# Altium schematic symbol library LATTICEPLDS_Library.SchLib: 291 symbols (part 10 of 32)
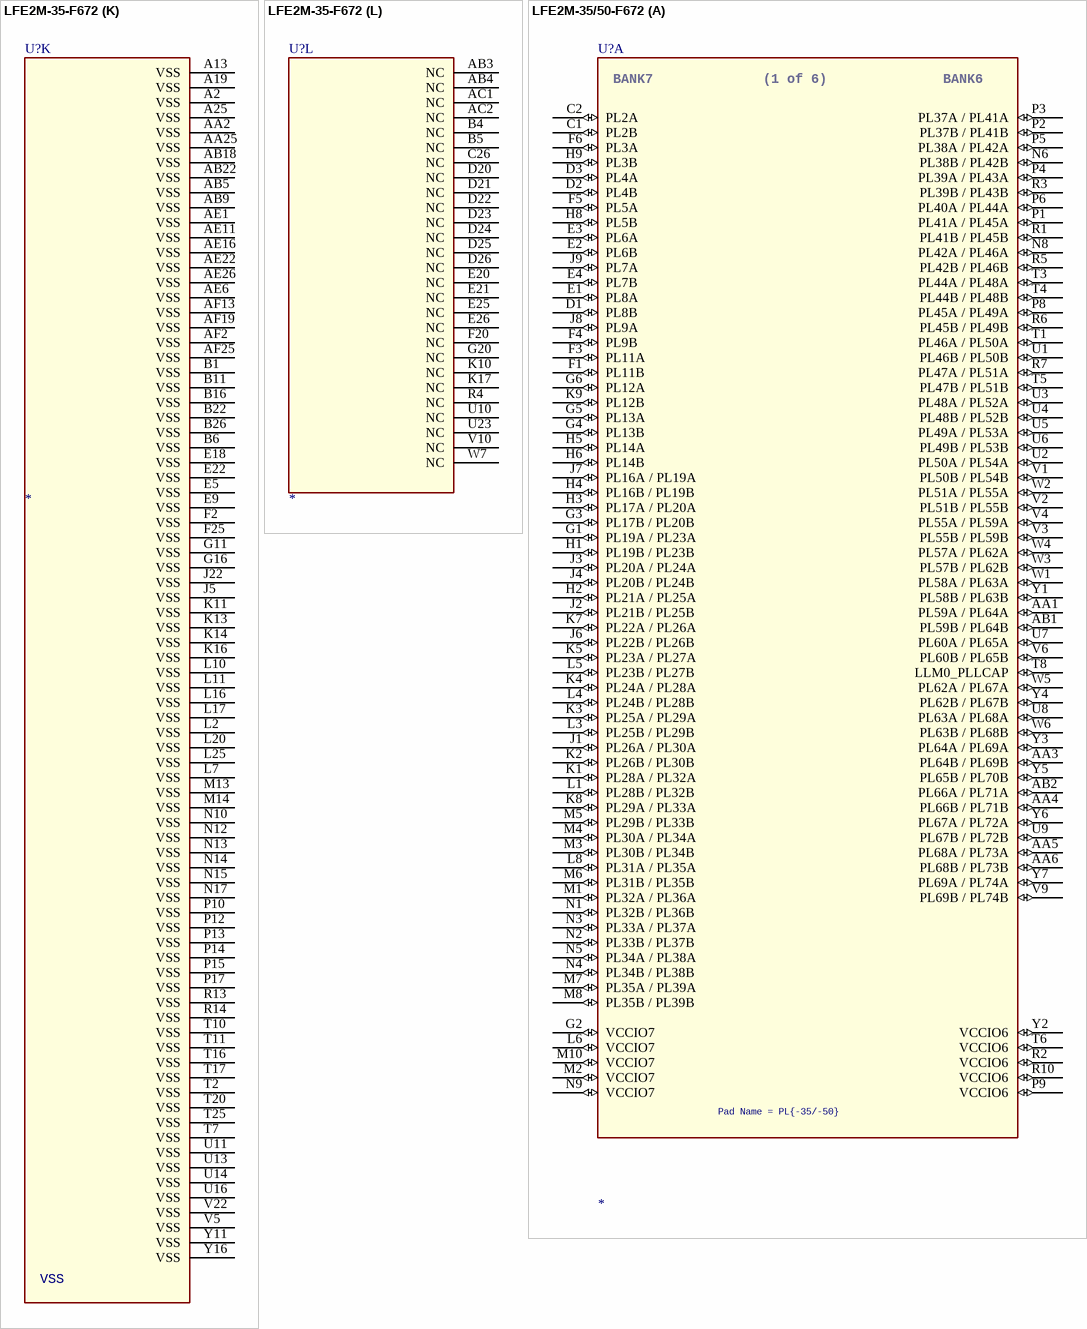
[diagram p312: symbols LFE2M-35-F672 to LFE2M-35/50-F672]

## LFE2M-35-F672
designator U?
SWAP_INFO: (S1+S2+S3+S4+S5+S6+S7+S8+S9+S10+S11+S12); SPLIT_INST: TRUE
part A pins: A14 U_HDINP3, A15 U_HDINP2, A17 U_HDOUTP3, A18 U_HDOUTP2, A20 U_HDOUTP1, A21 U_HDOUTP0, A23 U_HDINP1, A24 U_HDINP0, AB19 L_REFCLKN, AC19 L_REFCLKP, AE14 L_HDINN3, AE15 L_HDINN2, AE17 L_HDOUTN3, AE18 L_HDOUTN2, AE20 L_HDOUTN1, AE21 L_HDOUTN0, AE23 L_HDINN1, AE24 L_HDINN0, AF14 L_HDINP3, AF15 L_HDINP2, AF17 L_HDOUTP3, AF18 L_HDOUTP2, AF20 L_HDOUTP1, AF21 L_HDOUTP0, AF23 L_HDINP1, AF24 L_HDINP0, B14 U_HDINN3, B15 U_HDINN2, B17 U_HDOUTN3, B18 U_HDOUTN2, B20 U_HDOUTN1, B21 U_HDOUTN0, B23 U_HDINN1, B24 U_HDINN0, D19 U_REFCLKP, E19 U_REFCLKN
part B pins: AA21 CFG2, AA22 CFG1, AA23 INITN, AB23 CFG0, AB24 CCLK, AB25 DONE, AC3 TCK, AC4 TMS, AC26 PROGRAMN, V8 TDO, W8 TDI
part C pins: AA8 PB4B, AA9 PB8A, AA10 PB14A, AA12 PB21B, AA13 PB33A, AA14 PB42B, AA15 PB51A, AA17 PB60A, AA18 PB61A, AA19 PB65B, AA20 PB73B, AB6 PB2A, AB7 PB6A, AB8 PB12B, AB10 PB16B, AB11 PB19B, AB12 PB24B, AB13 PB33B, AB14 PB42A, AB15 PB49A, AB16 PB50B, AB17 PB54B, AB20 PB57A, AB21 PB69B, AC5 PB4A, AC6 PB5A, AC7 PB9A, AC8 PB14B, AC9 PB15B, AC10 PB23B, AC11 PB24A, AC12 PB34B, AC13 PB40A, AC14 PB41B, AC15 PB48A, AC16 PB49B, AC17 PB52B, AC20 PB58A, AC21 PB63A, AC22 PB69A, AC23 PB71A, AC25 PB71B, AD1 PB3A, AD2 PB3B, AD3 PB7A, AD4 PB7B, AD5 PB10B, AD6 PB13B, AD7 PB20A, AD8 PB21A, AD9 PB23A, AD10 PB25A, AD11 PB28A, AD12 PB35B, AD26 PB70B, AE2 PB10A, AE3 PB11B, AE4 PB11A, AE5 PB13A, AE8 PB22A, AE9 PB26B, AE10 PB27B, AF3 PB17A, AF4 PB17B, AF5 PB18A, AF6 PB18B, AF7 PB20B, AF8 PB22B, AF9 PB26A, AF10 PB27A, AF11 PB28B, AF12 PB35A, V17 PB73A, W9 PB5B, W10 PB8B, W11 PB12A, W12 PB15A, W13 PB16A, W14 PB34A, W15 PB54A, W16 PB59B, W17 PB65A, W20 PB72B, Y8 PB2B, Y9 PB6B, Y10 PB9B, Y12 PB19A, Y13 PB25B, Y14 PB40B, Y15 PB52A, Y17 PB61B, Y18 PB68B
part D pins: AA1 PL59A, AA3 PL64B, AA4 PL66B, AA5 PL68A, AA6 PL68B, AB1 PL59B, AB2 PL66A, C1 PL2B, C2 PL2A, D1 PL8B, D2 PL4B, D3 PL4A, E1 PL8A, E2 PL6B, E3 PL6A, E4 PL7B, F1 PL11B, F3 PL11A, F4 PL9B, F5 PL5A, F6 PL3A, G1 PL19A, G3 PL17B, G4 PL13B, G5 PL13A, G6 PL12A, H1 PL19B, H2 PL21A, H3 PL17A, H4 PL16B, H5 PL14A, H6 PL14B, H8 PL5B, H9 PL3B, J1 PL26A, J2 PL21B, J3 PL20A, J4 PL20B, J6 PL22B, J7 PL16A, J8 PL9A, J9 PL7A, K1 PL28A, K2 PL26B, K3 PL25A, K4 PL24A, K5 PL23A, K7 PL22A, K8 PL29A, K9 PL12B, L1 PL28B, L3 PL25B, L4 PL24B, L5 PL23B, L8 PL31A, M1 PL32A, M3 PL30B, M4 PL30A, M5 PL29B, M6 PL31B, M7 PL35A, M8 PL35B, N1 PL32B, N2 PL33B, N3 PL33A, N4 PL34B, N5 PL34A, N6 PL38B, N7 PL40B, N8 PL42A, P1 PL41A, P2 PL37B, P3 PL37A, P4 PL39A, P5 PL38A, P6 PL40A, P8 PL45A, R1 PL41B, R3 PL39B, R5 PL42B, R6 PL45B, R7 PL47A, T1 PL46A, T3 PL44A, T4 PL44B, T5 PL47B, U1 PL46B, U2 PL50A, U3 PL48A, U4 PL48B, U5 PL49A, U6 PL49B, U7 PL60A, U8 PL63A, U9 PL67B, V1 PL50B, V2 PL51B, V3 PL55B, V4 PL55A, V6 PL60B, V7 PL65A, V9 PL69B, W1 PL58A, W2 PL51A, W3 PL57B, W4 PL57A, W5 PL62A, W6 PL63B, Y1 PL58B, Y3 PL64A, Y4 PL62B, Y5 PL65B, Y6 PL67A, Y7 PL69A
part E pins: AA24 PR64A, AA26 PR59B, AB26 PR67B, E23 PR9A, E24 PR9B, F21 PR12A, F22 PR14A, F23 PR13B, F24 PR13A, F26 PR11A, G21 PR19B, G22 PR16B, G23 PR15A, G24 PR15B, G26 PR11B, H20 PR12B, H21 PR22B, H22 PR21B, H23 PR18B, H24 PR18A, H25 PR17B, H26 PR17A, J18 PR14B, J19 PR19A, J20 PR21A, J21 PR23A, J23 PR24B, J24 PR24A, J25 PR20B, J26 PR20A, K18 PR22A, K19 PR16A, K20 PR23B, K21 PR25A, K22 PR29B, K23 PR26A, K24 PR26B, K25 PR28B, K26 PR28A, L19 PR25B, L22 PR32B, L23 PR31B, L24 PR32A, L26 PR30A, M19 PR29A, M20 PR31A, M21 PR37B, M22 PR34B, M23 PR33B, M24 PR34A, M26 PR30B, N19 PR42A, N20 PR39B, N21 PR40B, N22 PR39A, N23 PR37A, N24 PR35B, N25 PR35A, N26 PR33A, P19 PR45A, P21 PR45B, P22 PR40A, P23 PR41B, P24 PR41A, P25 PR38B, P26 PR38A, R19 PR48A, R20 PR47A, R21 PR47B, R22 PR42B, R23 PR44B, R24 PR44A, R26 PR46A, T19 PR48B, T22 PR50B, T23 PR50A, T24 PR51A, T26 PR46B, U18 PR54B, U19 PR60A, U20 PR58A, U21 PR56A, U22 PR54A, U24 PR51B, U25 PR49B, U26 PR49A, V20 PR63A, V21 PR60B, V23 PR58B, V24 PR57A, V25 PR53B, V26 PR53A, W18 PR65A, W19 PR66B, W21 PR63B, W22 PR65B, W23 PR62B, W24 PR57B, W25 PR55B, W26 PR55A, Y19 PR68B, Y20 PR66A, Y21 PR68A, Y22 PR67A, Y23 PR64B, Y24 PR62A, Y26 PR59A
part F pins: A3 PT13A, A4 PT13B, A5 PT14A, A6 PT14B, A7 PT19A, A8 PT22A, A9 PT24B, A10 PT32B, A11 PT35A, A12 PT35B, B2 PT6B, B3 PT7B, B8 PT19B, B9 PT22B, B10 PT32A, C3 PT4B, C4 PT6A, C5 PT7A, C6 PT12B, C7 PT17A, C8 PT16B, C9 PT20A, C10 PT23B, C11 PT36B, C12 PT37B, D4 PT4A, D5 PT10B, D6 PT17B, D7 PT11B, D8 PT15B, D9 PT18B, D10 PT29B, D11 PT31B, D12 PT34B, D13 PT40A, D14 PT40B, D15 PT43A, D16 PT45A, D17 PT46A, E6 PT10A, E7 PT8A, E8 PT23A, E10 PT21A, E11 PT30B, E12 PT39A, E13 PT38A, E14 PT41A, E15 PT42A, E16 PT43B, E17 PT46B, F7 PT5A, F8 PT3A, F9 PT9A, F10 PT12A, F12 PT21B, F13 PT30A, F14 PT36A, F15 PT39B, F17 PT45B, F18 PT44A, F19 PT44B, G7 PT2A, G8 PT2B, G9 PT5B, G10 PT9B, G12 PT16A, G13 PT20B, G14 PT31A, G15 PT37A, G17 PT41B, G18 PT42B, H10 PT8B, H11 PT11A, H12 PT15A, H13 PT18A, H14 PT29A, H15 PT33A, H16 PT34A, H17 PT38B, H18 PT33B, J10 PT3B
part G pins: G19 RUM0_VCCPLL, H7 LUM0_VCCPLL, H19 XRES, J17 RUM1_VCCPLL, K6 LUM1_VCCPLL, P7 LLM2_VCCPLL, P20 RLM2_VCCPLL, R8 LLM0_VCCPLL, T8 LLM0_PLLCAP, V18 RLM0_VCCPLL, V19 RLM0_PLLCAP
part H pins: A16 U_VCCOB3 (power), A22 U_VCCOB0 (power), AD13 L_VCCRX3 (power), AD14 L_VCCRX2 (power), AD15 L_VCCIB2 (power), AD16 L_VCCTX3 (power), AD17 L_VCCTX2 (power), AD18 L_VCCOB2 (power), AD19 L_VCCP (power), AD20 L_VCCOB1 (power), AD21 L_VCCTX1 (power), AD22 L_VCCTX0 (power), AD23 L_VCCIB1 (power), AD24 L_VCCRX1 (power), AD25 L_VCCRX0 (power), AE13 L_VCCIB3 (power), AE19 L_VCCAUX33 (power), AE25 L_VCCIB0 (power), AF16 L_VCCOB3 (power), AF22 L_VCCOB0 (power), B13 U_VCCIB3 (power), B19 U_VCCAUX33 (power), B25 U_VCCIB0 (power), C13 U_VCCRX3 (power), C14 U_VCCRX2 (power), C15 U_VCCIB2 (power), C16 U_VCCTX3 (power), C17 U_VCCTX2 (power), C18 U_VCCOB2 (power), C19 U_VCCP (power), C20 U_VCCOB1 (power), C21 U_VCCTX1 (power), C22 U_VCCTX0 (power), C23 U_VCCIB1 (power), C24 U_VCCRX1 (power), C25 U_VCCRX0 (power)
part I pins: L12 VCC (power), L13 VCC (power), L14 VCC (power), L15 VCC (power), M11 VCC (power), M12 VCC (power), M15 VCC (power), M16 VCC (power), N11 VCC (power), N16 VCC (power), P11 VCC (power), P16 VCC (power), R11 VCC (power), R12 VCC (power), R15 VCC (power), R16 VCC (power), T12 VCC (power), T13 VCC (power), T14 VCC (power), T15 VCC (power)
part J pins: AA7 VCCJ (power), AA11 VCCIO5 (power), AA16 VCCIO4 (power), AC18 VCCIO4 (power), AC24 VCCIO8 (power), AE7 VCCIO5 (power), AE12 VCCIO5 (power), B7 VCCIO0 (power), B12 VCCIO0 (power), D18 VCCIO1 (power), F11 VCCIO0 (power), F16 VCCIO1 (power), G2 VCCIO7 (power), G25 VCCIO2 (power), J11 VCCAUX (power), J12 VCCAUX (power), J13 VCCIO0 (power), J14 VCCIO1 (power), J15 VCCAUX (power), J16 VCCAUX (power), K12 VCCIO0 (power), K15 VCCIO1 (power), L6 VCCIO7 (power), L9 VCCAUX (power), L18 VCCAUX (power), L21 VCCIO2 (power), M2 VCCIO7 (power), M9 VCCAUX (power), M10 VCCIO7 (power), M17 VCCIO2 (power), M18 VCCAUX (power), M25 VCCIO2 (power), N9 VCCIO7 (power), N18 VCCIO2 (power), P9 VCCIO6 (power), P18 VCCIO3 (power), R2 VCCIO6 (power), R9 VCCAUX (power), R10 VCCIO6 (power), R17 VCCIO3 (power), R18 VCCAUX (power), R25 VCCIO3 (power), T6 VCCIO6 (power), T9 VCCAUX (power), T18 VCCAUX (power), T21 VCCIO3 (power), U12 VCCIO5 (power), U15 VCCIO4 (power), U17 VCCIO8 (power), V11 VCCAUX (power), V12 VCCAUX (power), V13 VCCIO5 (power), V14 VCCIO4 (power), V15 VCCAUX (power), V16 VCCAUX (power), Y2 VCCIO6 (power), Y25 VCCIO3 (power)
part K pins: A2 VSS (power), A13 VSS (power), A19 VSS (power), A25 VSS (power), AA2 VSS (power), AA25 VSS (power), AB5 VSS (power), AB9 VSS (power), AB18 VSS (power), AB22 VSS (power), AE1 VSS (power), AE6 VSS (power), AE11 VSS (power), AE16 VSS (power), AE22 VSS (power), AE26 VSS (power), AF2 VSS (power), AF13 VSS (power), AF19 VSS (power), AF25 VSS (power), B1 VSS (power), B6 VSS (power), B11 VSS (power), B16 VSS (power), B22 VSS (power), B26 VSS (power), E5 VSS (power), E9 VSS (power), E18 VSS (power), E22 VSS (power), F2 VSS (power), F25 VSS (power), G11 VSS (power), G16 VSS (power), J5 VSS (power), J22 VSS (power), K11 VSS (power), K13 VSS (power), K14 VSS (power), K16 VSS (power), L2 VSS (power), L7 VSS (power), L10 VSS (power), L11 VSS (power), L16 VSS (power), L17 VSS (power), L20 VSS (power), L25 VSS (power), M13 VSS (power), M14 VSS (power), N10 VSS (power), N12 VSS (power), N13 VSS (power), N14 VSS (power), N15 VSS (power), N17 VSS (power), P10 VSS (power), P12 VSS (power), P13 VSS (power), P14 VSS (power), P15 VSS (power), P17 VSS (power), R13 VSS (power), R14 VSS (power), T2 VSS (power), T7 VSS (power), T10 VSS (power), T11 VSS (power), T16 VSS (power), T17 VSS (power), T20 VSS (power), T25 VSS (power), U11 VSS (power), U13 VSS (power), U14 VSS (power), U16 VSS (power), V5 VSS (power), V22 VSS (power), Y11 VSS (power), Y16 VSS (power)
part L pins: AB3 NC, AB4 NC, AC1 NC, AC2 NC, B4 NC, B5 NC, C26 NC, D20 NC, D21 NC, D22 NC, D23 NC, D24 NC, D25 NC, D26 NC, E20 NC, E21 NC, E25 NC, E26 NC, F20 NC, G20 NC, K10 NC, K17 NC, R4 NC, U10 NC, U23 NC, V10 NC, W7 NC
part A text: SERDES
part B text: CONFIG
part C text: Bank5; Bank4; Bottom
part D text: Bank7; Bank6; Left
part E text: Bank2; Bank3; Right
part F text: Bank0; Top
part G text: PLL
part H text: SERDES Supplies
part I text: VCC Core
part J text: Power / Supplies

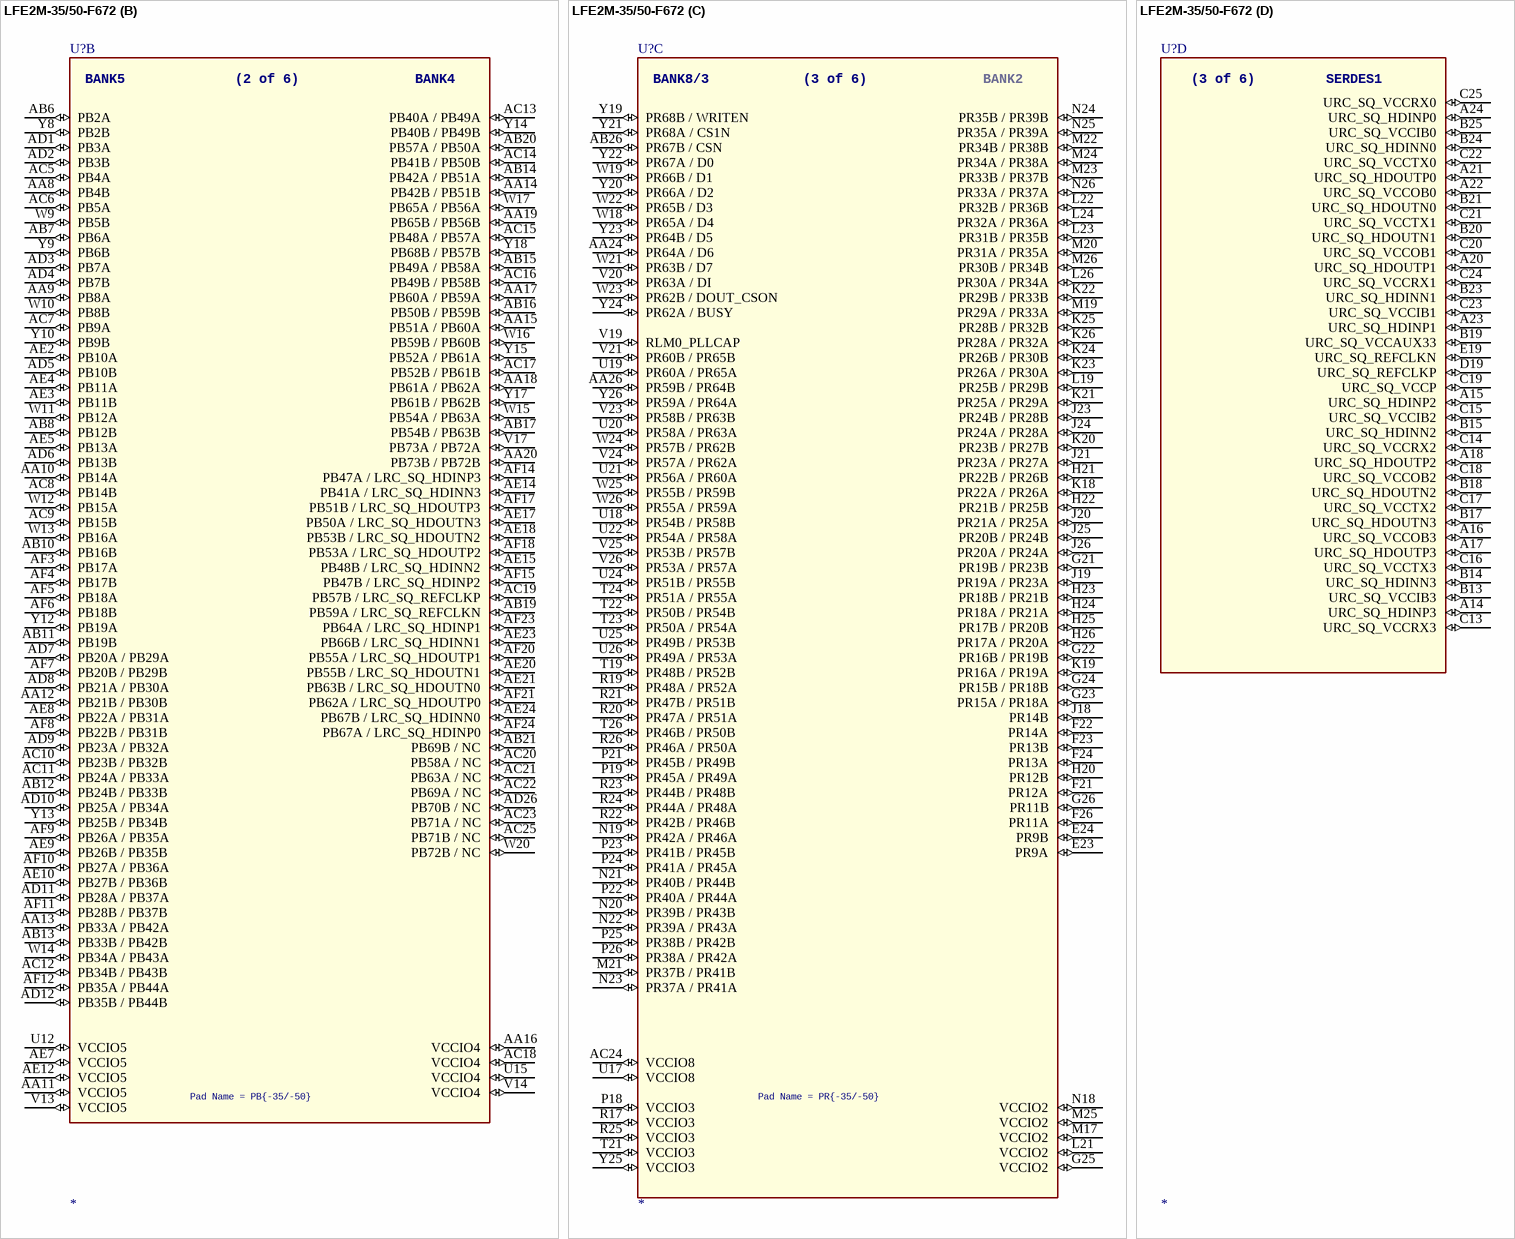
[diagram p103: symbol LFE2M-35/50-F672]

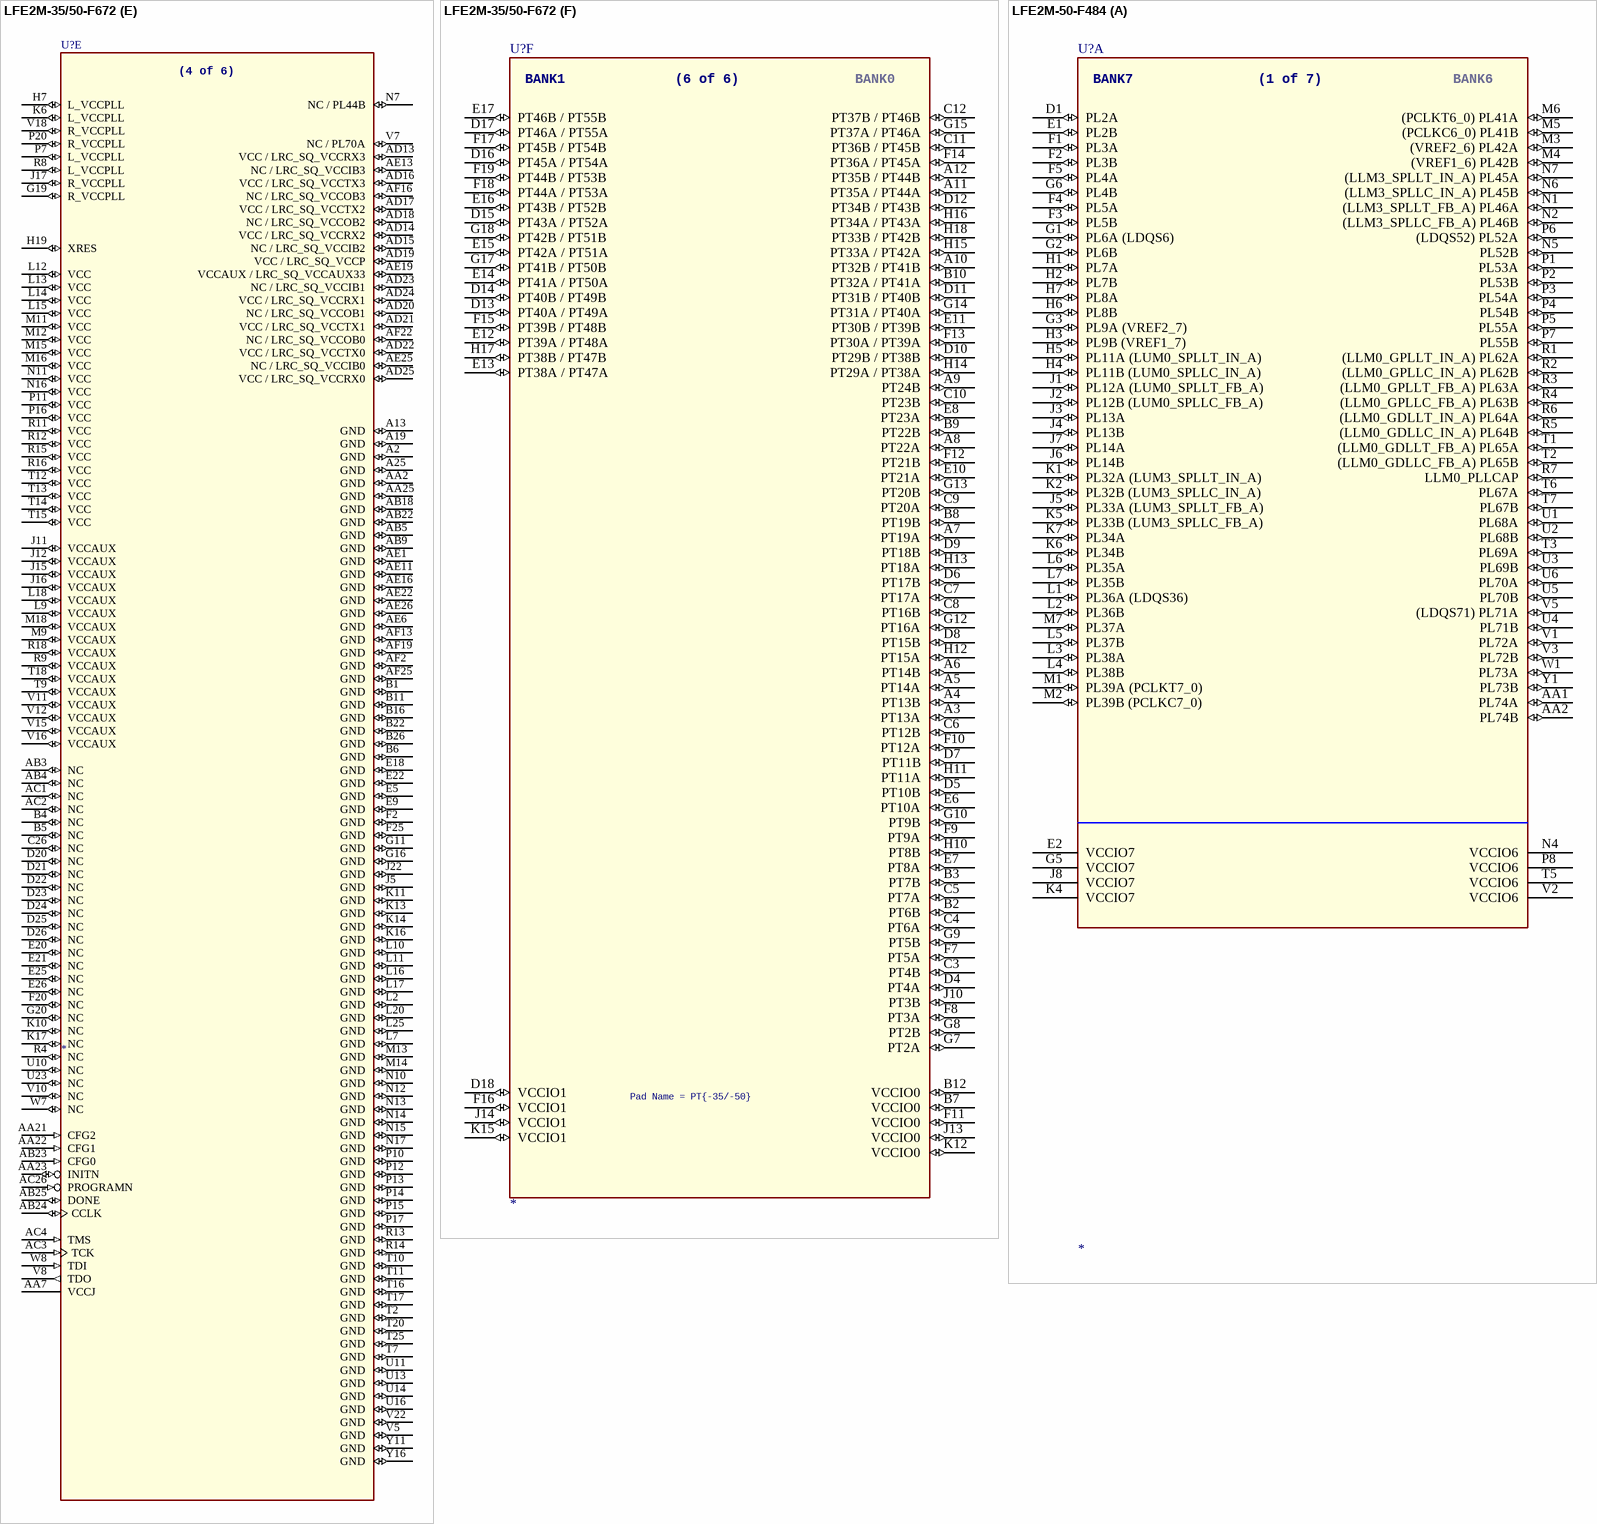
[diagram p104: symbols LFE2M-35/50-F672 to LFE2M-50-F484]

## LFE2M-35/50-F672
designator U?
SPLIT_INST: TRUE; SWAP_INFO: (S1+S2+S3+S4+S5+S6)
part A pins: AA1 PL59A / PL64A (io), AA3 PL64B / PL69B (io), AA4 PL66B / PL71B (io), AA5 PL68A / PL73A (io), AA6 PL68B / PL73B (io), AB1 PL59B / PL64B (io), AB2 PL66A / PL71A (io), C1 PL2B (io), C2 PL2A (io), D1 PL8B (io), D2 PL4B (io), D3 PL4A (io), E1 PL8A (io), E2 PL6B (io), E3 PL6A (io), E4 PL7B (io), F1 PL11B (io), F3 PL11A (io), F4 PL9B (io), F5 PL5A (io), F6 PL3A (io), G1 PL19A / PL23A (io), G2 VCCIO7 (io), G3 PL17B / PL20B (io), G4 PL13B (io), G5 PL13A (io), G6 PL12A (io), H1 PL19B / PL23B (io), H2 PL21A / PL25A (io), H3 PL17A / PL20A (io), H4 PL16B / PL19B (io), H5 PL14A (io), H6 PL14B (io), H8 PL5B (io), H9 PL3B (io), J1 PL26A / PL30A (io), J2 PL21B / PL25B (io), J3 PL20A / PL24A (io), J4 PL20B / PL24B (io), J6 PL22B / PL26B (io), J7 PL16A / PL19A (io), J8 PL9A (io), J9 PL7A (io), K1 PL28A / PL32A (io), K2 PL26B / PL30B (io), K3 PL25A / PL29A (io), K4 PL24A / PL28A (io), K5 PL23A / PL27A (io), K7 PL22A / PL26A (io), K8 PL29A / PL33A (io), K9 PL12B (io), L1 PL28B / PL32B (io), L3 PL25B / PL29B (io), L4 PL24B / PL28B (io), L5 PL23B / PL27B (io), L6 VCCIO7 (io), L8 PL31A / PL35A (io), M1 PL32A / PL36A (io), M2 VCCIO7 (io), M3 PL30B / PL34B (io), M4 PL30A / PL34A (io), M5 PL29B / PL33B (io), M6 PL31B / PL35B (io), M7 PL35A / PL39A (io), M8 PL35B / PL39B (io), M10 VCCIO7 (io), N1 PL32B / PL36B (io), N2 PL33B / PL37B (io), N3 PL33A / PL37A (io), N4 PL34B / PL38B (io), N5 PL34A / PL38A (io), N6 PL38B / PL42B (io), N8 PL42A / PL46A (io), N9 VCCIO7 (io), P1 PL41A / PL45A (io), P2 PL37B / PL41B (io), P3 PL37A / PL41A (io), P4 PL39A / PL43A (io), P5 PL38A / PL42A (io), P6 PL40A / PL44A (io), P8 PL45A / PL49A (io), P9 VCCIO6 (io), R1 PL41B / PL45B (io), R2 VCCIO6 (io), R3 PL39B / PL43B (io), R5 PL42B / PL46B (io), R6 PL45B / PL49B (io), R7 PL47A / PL51A (io), R10 VCCIO6 (io), T1 PL46A / PL50A (io), T3 PL44A / PL48A (io), T4 PL44B / PL48B (io), T5 PL47B / PL51B (io), T6 VCCIO6 (io), T8 LLM0_PLLCAP (io), U1 PL46B / PL50B (io), U2 PL50A / PL54A (io), U3 PL48A / PL52A (io), U4 PL48B / PL52B (io), U5 PL49A / PL53A (io), U6 PL49B / PL53B (io), U7 PL60A / PL65A (io), U8 PL63A / PL68A (io), U9 PL67B / PL72B (io), V1 PL50B / PL54B (io), V2 PL51B / PL55B (io), V3 PL55B / PL59B (io), V4 PL55A / PL59A (io), V6 PL60B / PL65B (io), V9 PL69B / PL74B (io), W1 PL58A / PL63A (io), W2 PL51A / PL55A (io), W3 PL57B / PL62B (io), W4 PL57A / PL62A (io), W5 PL62A / PL67A (io), W6 PL63B / PL68B (io), Y1 PL58B / PL63B (io), Y2 VCCIO6 (io), Y3 PL64A / PL69A (io), Y4 PL62B / PL67B (io), Y5 PL65B / PL70B (io), Y6 PL67A / PL72A (io), Y7 PL69A / PL74A (io)
part B pins: AA8 PB4B (io), AA9 PB8A (io), AA10 PB14A (io), AA11 VCCIO5 (io), AA12 PB21B / PB30B (io), AA13 PB33A / PB42A (io), AA14 PB42B / PB51B (io), AA15 PB51A / PB60A (io), AA16 VCCIO4 (io), AA17 PB60A / PB59A (io), AA18 PB61A / PB62A (io), AA19 PB65B / PB56B (io), AA20 PB73B / PB72B (io), AB6 PB2A (io), AB7 PB6A (io), AB8 PB12B (io), AB10 PB16B (io), AB11 PB19B (io), AB12 PB24B / PB33B (io), AB13 PB33B / PB42B (io), AB14 PB42A / PB51A (io), AB15 PB49A / PB58A (io), AB16 PB50B / PB59B (io), AB17 PB54B / PB63B (io), AB19 PB59A / LRC_SQ_REFCLKN (io), AB20 PB57A / PB50A (io), AB21 PB69B / NC (io), AC5 PB4A (io), AC6 PB5A (io), AC7 PB9A (io), AC8 PB14B (io), AC9 PB15B (io), AC10 PB23B / PB32B (io), AC11 PB24A / PB33A (io), AC12 PB34B / PB43B (io), AC13 PB40A / PB49A (io), AC14 PB41B / PB50B (io), AC15 PB48A / PB57A (io), AC16 PB49B / PB58B (io), AC17 PB52B / PB61B (io), AC18 VCCIO4 (io), AC19 PB57B / LRC_SQ_REFCLKP (io), AC20 PB58A / NC (io), AC21 PB63A / NC (io), AC22 PB69A / NC (io), AC23 PB71A / NC (io), AC25 PB71B / NC (io), AD1 PB3A (io), AD2 PB3B (io), AD3 PB7A (io), AD4 PB7B (io), AD5 PB10B (io), AD6 PB13B (io), AD7 PB20A / PB29A (io), AD8 PB21A / PB30A (io), AD9 PB23A / PB32A (io), AD10 PB25A / PB34A (io), AD11 PB28A / PB37A (io), AD12 PB35B / PB44B (io), AD26 PB70B / NC (io), AE2 PB10A (io), AE3 PB11B (io), AE4 PB11A (io), AE5 PB13A (io), AE7 VCCIO5 (io), AE8 PB22A / PB31A (io), AE9 PB26B / PB35B (io), AE10 PB27B / PB36B (io), AE12 VCCIO5 (io), AE14 PB41A / LRC_SQ_HDINN3 (io), AE15 PB48B / LRC_SQ_HDINN2 (io), AE17 PB50A / LRC_SQ_HDOUTN3 (io), AE18 PB53B / LRC_SQ_HDOUTN2 (io), AE20 PB55B / LRC_SQ_HDOUTN1 (io), AE21 PB63B / LRC_SQ_HDOUTN0 (io), AE23 PB66B / LRC_SQ_HDINN1 (io), AE24 PB67B / LRC_SQ_HDINN0 (io), AF3 PB17A (io), AF4 PB17B (io), AF5 PB18A (io), AF6 PB18B (io), AF7 PB20B / PB29B (io), AF8 PB22B / PB31B (io), AF9 PB26A / PB35A (io), AF10 PB27A / PB36A (io), AF11 PB28B / PB37B (io), AF12 PB35A / PB44A (io), AF14 PB47A / LRC_SQ_HDINP3 (io), AF15 PB47B / LRC_SQ_HDINP2 (io), AF17 PB51B / LRC_SQ_HDOUTP3 (io), AF18 PB53A / LRC_SQ_HDOUTP2 (io), AF20 PB55A / LRC_SQ_HDOUTP1 (io), AF21 PB62A / LRC_SQ_HDOUTP0 (io), AF23 PB64A / LRC_SQ_HDINP1 (io), AF24 PB67A / LRC_SQ_HDINP0 (io), U12 VCCIO5 (io), U15 VCCIO4 (io), V13 VCCIO5 (io), V14 VCCIO4 (io), V17 PB73A / PB72A (io), W9 PB5B (io), W10 PB8B (io), W11 PB12A (io), W12 PB15A (io), W13 PB16A (io), W14 PB34A / PB43A (io), W15 PB54A / PB63A (io), W16 PB59B / PB60B (io), W17 PB65A / PB56A (io), W20 PB72B / NC (io), Y8 PB2B (io), Y9 PB6B (io), Y10 PB9B (io), Y12 PB19A (io), Y13 PB25B / PB34B (io), Y14 PB40B / PB49B (io), Y15 PB52A / PB61A (io), Y17 PB61B / PB62B (io), Y18 PB68B / PB57B (io)
part C pins: AA24 PR64A / D6 (io), AA26 PR59B / PR64B (io), AB26 PR67B / CSN (io), AC24 VCCIO8 (io), E23 PR9A (io), E24 PR9B (io), F21 PR12A (io), F22 PR14A (io), F23 PR13B (io), F24 PR13A (io), F26 PR11A (io), G21 PR19B / PR23B (io), G22 PR16B / PR19B (io), G23 PR15A / PR18A (io), G24 PR15B / PR18B (io), G25 VCCIO2 (io), G26 PR11B (io), H20 PR12B (io), H21 PR22B / PR26B (io), H22 PR21B / PR25B (io), H23 PR18B / PR21B (io), H24 PR18A / PR21A (io), H25 PR17B / PR20B (io), H26 PR17A / PR20A (io), J18 PR14B (io), J19 PR19A / PR23A (io), J20 PR21A / PR25A (io), J21 PR23A / PR27A (io), J23 PR24B / PR28B (io), J24 PR24A / PR28A (io), J25 PR20B / PR24B (io), J26 PR20A / PR24A (io), K18 PR22A / PR26A (io), K19 PR16A / PR19A (io), K20 PR23B / PR27B (io), K21 PR25A / PR29A (io), K22 PR29B / PR33B (io), K23 PR26A / PR30A (io), K24 PR26B / PR30B (io), K25 PR28B / PR32B (io), K26 PR28A / PR32A (io), L19 PR25B / PR29B (io), L21 VCCIO2 (io), L22 PR32B / PR36B (io), L23 PR31B / PR35B (io), L24 PR32A / PR36A (io), L26 PR30A / PR34A (io), M17 VCCIO2 (io), M19 PR29A / PR33A (io), M20 PR31A / PR35A (io), M21 PR37B / PR41B (io), M22 PR34B / PR38B (io), M23 PR33B / PR37B (io), M24 PR34A / PR38A (io), M25 VCCIO2 (io), M26 PR30B / PR34B (io), N18 VCCIO2 (io), N19 PR42A / PR46A (io), N20 PR39B / PR43B (io), N21 PR40B / PR44B (io), N22 PR39A / PR43A (io), N23 PR37A / PR41A (io), N24 PR35B / PR39B (io), N25 PR35A / PR39A (io), N26 PR33A / PR37A (io), P18 VCCIO3 (io), P19 PR45A / PR49A (io), P21 PR45B / PR49B (io), P22 PR40A / PR44A (io), P23 PR41B / PR45B (io), P24 PR41A / PR45A (io), P25 PR38B / PR42B (io), P26 PR38A / PR42A (io), R17 VCCIO3 (io), R19 PR48A / PR52A (io), R20 PR47A / PR51A (io), R21 PR47B / PR51B (io), R22 PR42B / PR46B (io), R23 PR44B / PR48B (io), R24 PR44A / PR48A (io), R25 VCCIO3 (io), R26 PR46A / PR50A (io), T19 PR48B / PR52B (io), T21 VCCIO3 (io), T22 PR50B / PR54B (io), T23 PR50A / PR54A (io), T24 PR51A / PR55A (io), T26 PR46B / PR50B (io), U17 VCCIO8 (io), U18 PR54B / PR58B (io), U19 PR60A / PR65A (io), U20 PR58A / PR63A (io), U21 PR56A / PR60A (io), U22 PR54A / PR58A (io), U24 PR51B / PR55B (io), U25 PR49B / PR53B (io), U26 PR49A / PR53A (io), V19 RLM0_PLLCAP (io), V20 PR63A / DI (io), V21 PR60B / PR65B (io), V23 PR58B / PR63B (io), V24 PR57A / PR62A (io), V25 PR53B / PR57B (io), V26 PR53A / PR57A (io), W18 PR65A / D4 (io), W19 PR66B / D1 (io), W21 PR63B / D7 (io), W22 PR65B / D3 (io), W23 PR62B / DOUT_CSON (io), W24 PR57B / PR62B (io), W25 PR55B / PR59B (io), W26 PR55A / PR59A (io), Y19 PR68B / WRITEN (io), Y20 PR66A / D2 (io), Y21 PR68A / CS1N (io), Y22 PR67A / D0 (io), Y23 PR64B / D5 (io), Y24 PR62A / BUSY (io), Y25 VCCIO3 (io), Y26 PR59A / PR64A (io)
part D pins: A14 URC_SQ_HDINP3 (io), A15 URC_SQ_HDINP2 (io), A16 URC_SQ_VCCOB3 (io), A17 URC_SQ_HDOUTP3 (io), A18 URC_SQ_HDOUTP2 (io), A20 URC_SQ_HDOUTP1 (io), A21 URC_SQ_HDOUTP0 (io), A22 URC_SQ_VCCOB0 (io), A23 URC_SQ_HDINP1 (io), A24 URC_SQ_HDINP0 (io), B13 URC_SQ_VCCIB3 (io), B14 URC_SQ_HDINN3 (io), B15 URC_SQ_HDINN2 (io), B17 URC_SQ_HDOUTN3 (io), B18 URC_SQ_HDOUTN2 (io), B19 URC_SQ_VCCAUX33 (io), B20 URC_SQ_HDOUTN1 (io), B21 URC_SQ_HDOUTN0 (io), B23 URC_SQ_HDINN1 (io), B24 URC_SQ_HDINN0 (io), B25 URC_SQ_VCCIB0 (io), C13 URC_SQ_VCCRX3 (io), C14 URC_SQ_VCCRX2 (io), C15 URC_SQ_VCCIB2 (io), C16 URC_SQ_VCCTX3 (io), C17 URC_SQ_VCCTX2 (io), C18 URC_SQ_VCCOB2 (io), C19 URC_SQ_VCCP (io), C20 URC_SQ_VCCOB1 (io), C21 URC_SQ_VCCTX1 (io), C22 URC_SQ_VCCTX0 (io), C23 URC_SQ_VCCIB1 (io), C24 URC_SQ_VCCRX1 (io), C25 URC_SQ_VCCRX0 (io), D19 URC_SQ_REFCLKP (io), E19 URC_SQ_REFCLKN (io)
part E pins: A2 GND (io), A13 GND (io), A19 GND (io), A25 GND (io), AA2 GND (io), AA7 VCCJ (power), AA21 CFG2 (in), AA22 CFG1 (in), AA23 INITN (io), AA25 GND (io), AB3 NC (io), AB4 NC (io), AB5 GND (io), AB9 GND (io), AB18 GND (io), AB22 GND (io), AB23 CFG0 (in), AB24 CCLK (io), AB25 DONE (io), AC1 NC (io), AC2 NC (io), AC3 TCK (in), AC4 TMS (in), AC26 PROGRAMN (in), AD13 VCC / LRC_SQ_VCCRX3 (io), AD14 VCC / LRC_SQ_VCCRX2 (io), AD15 NC / LRC_SQ_VCCIB2 (io), AD16 VCC / LRC_SQ_VCCTX3 (io), AD17 VCC / LRC_SQ_VCCTX2 (io), AD18 NC / LRC_SQ_VCCOB2 (io), AD19 VCC / LRC_SQ_VCCP (io), AD20 NC / LRC_SQ_VCCOB1 (io), AD21 VCC / LRC_SQ_VCCTX1 (io), AD22 VCC / LRC_SQ_VCCTX0 (io), AD23 NC / LRC_SQ_VCCIB1 (io), AD24 VCC / LRC_SQ_VCCRX1 (io), AD25 VCC / LRC_SQ_VCCRX0 (io), AE1 GND (io), AE6 GND (io), AE11 GND (io), AE13 NC / LRC_SQ_VCCIB3 (io), AE16 GND (io), AE19 VCCAUX / LRC_SQ_VCCAUX33 (io), AE22 GND (io), AE25 NC / LRC_SQ_VCCIB0 (io), AE26 GND (io), AF2 GND (io), AF13 GND (io), AF16 NC / LRC_SQ_VCCOB3 (io), AF19 GND (io), AF22 NC / LRC_SQ_VCCOB0 (io), AF25 GND (io), B1 GND (io), B4 NC (io), B5 NC (io), B6 GND (io), B11 GND (io), B16 GND (io), B22 GND (io), B26 GND (io), C26 NC (io), D20 NC (io), D21 NC (io), D22 NC (io), D23 NC (io), D24 NC (io), D25 NC (io), D26 NC (io), E5 GND (io), E9 GND (io), E18 GND (io), E20 NC (io), E21 NC (io), E22 GND (io), E25 NC (io), E26 NC (io), F2 GND (io), F20 NC (io), F25 GND (io), G11 GND (io), G16 GND (io), G19 R_VCCPLL (io), G20 NC (io), H7 L_VCCPLL (io), H19 XRES (io), J5 GND (io), J11 VCCAUX (io), J12 VCCAUX (io), J15 VCCAUX (io), J16 VCCAUX (io), J17 R_VCCPLL (io), J22 GND (io), K6 L_VCCPLL (io), K10 NC (io), K11 GND (io), K13 GND (io), K14 GND (io), K16 GND (io), K17 NC (io), L2 GND (io), L7 GND (io), L9 VCCAUX (io), L10 GND (io), L11 GND (io), L12 VCC (io), L13 VCC (io), L14 VCC (io), L15 VCC (io), L16 GND (io), L17 GND (io), L18 VCCAUX (io), L20 GND (io), L25 GND (io), M9 VCCAUX (io), M11 VCC (io), M12 VCC (io), M13 GND (io), M14 GND (io), M15 VCC (io), M16 VCC (io), M18 VCCAUX (io), N7 NC / PL44B (io), N10 GND (io), N11 VCC (io), N12 GND (io), N13 GND (io), N14 GND (io), N15 GND (io), N16 VCC (io), N17 GND (io), P7 L_VCCPLL (io), P10 GND (io), P11 VCC (io), P12 GND (io), P13 GND (io), P14 GND (io), P15 GND (io), P16 VCC (io), P17 GND (io), P20 R_VCCPLL (io), R4 NC (io), R8 L_VCCPLL (io), R9 VCCAUX (io), R11 VCC (io), R12 VCC (io), R13 GND (io), R14 GND (io), R15 VCC (io), R16 VCC (io), R18 VCCAUX (io), T2 GND (io), T7 GND (io), T9 VCCAUX (io), T10 GND (io), T11 GND (io), T12 VCC (io), T13 VCC (io), T14 VCC (io), T15 VCC (io), T16 GND (io), T17 GND (io), T18 VCCAUX (io), T20 GND (io), T25 GND (io), U10 NC (io), U11 GND (io), U13 GND (io), U14 GND (io), U16 GND (io), U23 NC (io), V5 GND (io), V7 NC / PL70A (io), V8 TDO (out), V10 NC (io), V11 VCCAUX (io), V12 VCCAUX (io), V15 VCCAUX (io), V16 VCCAUX (io), V18 R_VCCPLL (io), V22 GND (io), W7 NC (io), W8 TDI (in), Y11 GND (io), Y16 GND (io)